# Altium footprint library PASSIVE_THD.PCBLIB: 83 footprints (part 2 of 6)
Each footprint in its own frame and in the unit in brackets; x right, y up, seen from the top. Pads: shape width x height; smd on the part's side, far side on the other; paste and mask are expansions set on the pad; w line width, h text height; cw(c..) or ccw(c..) is an arc to the next point about the centre after c.
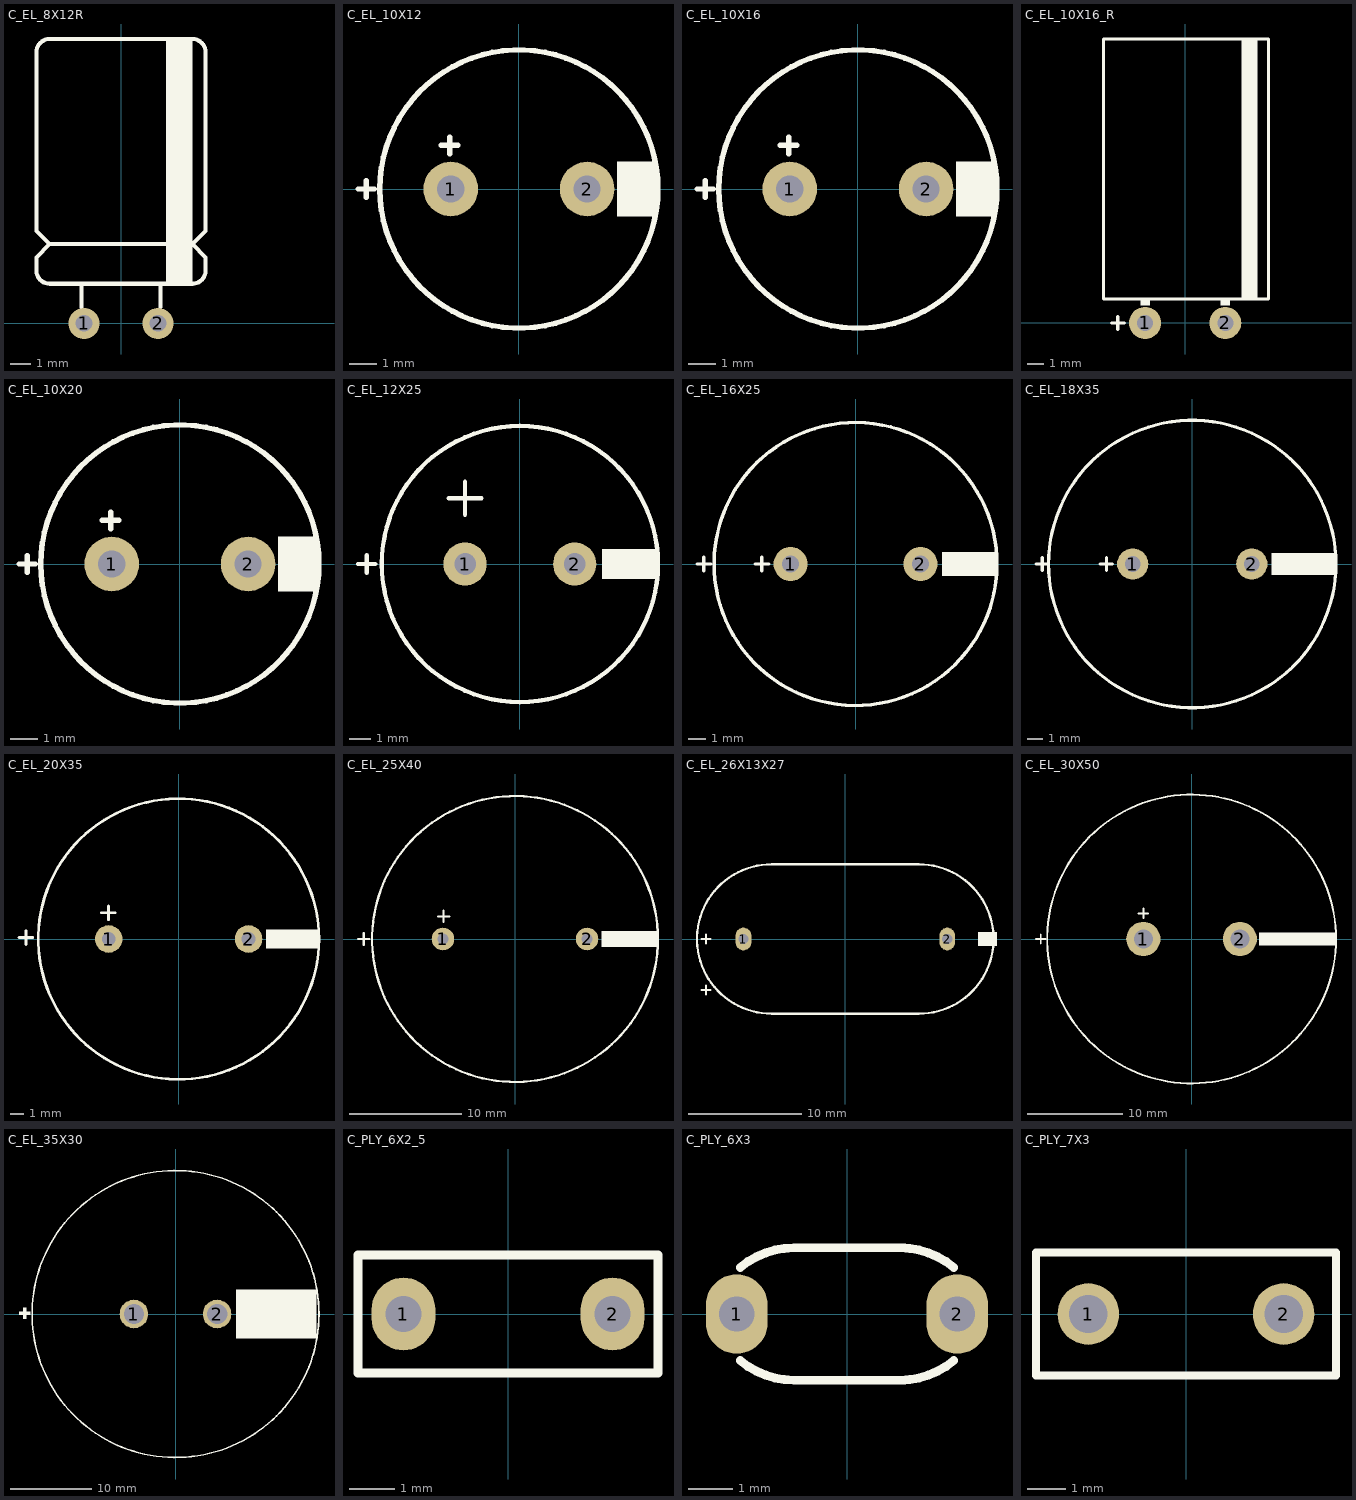
[diagram p1: the footprints below, top view; thin cyan lines are the x and y axes]

## C_EL_8X12R [mm] "Cap Elec, D8.0X12.0H pitch: 3.5mm, RIGHT ANGLE"
pads (2):
  round 1.5 hole 0.8: 1(-1.778,0) 2(1.778,0)
TopOverlay:
  region: 2.159,13.67 2.159,1.905 3.429,1.905 3.429,13.67
  lines w0.2: -1.905,0.762 -1.905,1.905 ; 1.905,0.787 1.905,1.905 ; -3.429,3.81 3.429,3.81 ; -3.429,3.81 -4.064,3.175 -4.064,2.54 ccw(c-3.429,2.54) -3.429,1.905 3.429,1.905 ccw(c3.429,2.54) 4.064,2.54 4.064,3.175 3.429,3.81 ; -3.429,3.81 -4.064,4.445 -4.064,13.035 cw(c-3.429,13.035) -3.429,13.67 3.429,13.67 cw(c3.429,13.035) 4.064,13.035 4.064,4.445 3.429,3.81
3D body "User Library-Cap electro 8x11_5x3_5mm RA.step": height 8.03, standoff -2, extent -4.025,-0.3 4.025,13.521

## C_EL_10X12 [mm] "Cap Elec, D10.0X12.0H pitch: 5.0mm"
height 12
pads (2):
  round 2 hole 1: 1(-2.5,0) 2(2.5,0)
TopOverlay:
  circle w0.2: c0,0 r5.1
  rectangle: 3.6,-1 5.1,1
  lines w0.2: -5.9,0 -5.3,0 ; -5.6,-0.3 -5.6,0.3 ; -2.84,1.6 -2.24,1.6 ; -2.54,1.3 -2.54,1.9
3D body "ELE Radial 10x12.STEP": height 13.7, standoff -1.7, extent -5.069,-5.081 5.05,5.044

## C_EL_10X16 [mm] "Cap Elec, D10.0X16.0H pitch: 5.0mm"
height 16
pads (2):
  round 2 hole 1: 1(-2.5,0) 2(2.5,0)
TopOverlay:
  circle w0.2: c0,0 r5.1
  rectangle: 3.6,-1 5.1,1
  lines w0.2: -5.9,0 -5.3,0 ; -5.6,-0.3 -5.6,0.3 ; -2.84,1.6 -2.24,1.6 ; -2.54,1.3 -2.54,1.9
3D body "User Library-Cap-EL(10x16-5).step": height 16, standoff -3.3, extent -5,-5 5.002,5

## C_EL_10X16_R [mm] "Cap Elec, D10.0X16.0H pitch: 5.0mm"
height 16
pads (2):
  round 2 hole 1: 1(-2.5,0) 2(2.5,0)
TopOverlay:
  region: 2.8,1.5 2.2,1.5 2.2,1.1 2.8,1.1
  rectangle: -2.8,1.1 -2.2,1.5
  rectangle: 3.5,1.5 4.5,17.7
  lines w0.2: -4.6,0 -3.8,0 ; -4.2,-0.4 -4.2,0.4 ; -5.1,1.5 -5.1,17.7 5.2,17.7 5.2,1.5 -5.1,1.5
3D body "User Library-Cap electro 10x16x5_0mm RA.step": height 10.03, standoff -3.68, extent -5.025,-0.363 5.026,17.626

## C_EL_10X20 [mm] "Cap Elec, D10.0X20.0H pitch: 5.0mm, RB.2/.4"
height 20
pads (2):
  round 2 hole 1: 1(-2.5,0) 2(2.5,0)
TopOverlay:
  circle w0.2: c0,0 r5.1
  rectangle: 3.6,-1 5.1,1
  lines w0.2: -5.9,0 -5.3,0 ; -5.6,-0.3 -5.6,0.3 ; -2.84,1.6 -2.24,1.6 ; -2.54,1.3 -2.54,1.9
3D body "CE_R200_D400_H800.step": height 20.62, standoff -2.6, extent -5.08,-5.1 5.08,5.038

## C_EL_12X25 [mm] "Cap Elec, D12.0X25.0H pitch: 5.0mm, RB.2/.5"
pads (2):
  round 2 hole 1: 1(-2.54,0) 2(2.54,0)
TopOverlay:
  circle w0.2: c0,0 r6.4
  rectangle: 3.8,-0.7 6.4,0.7
  lines w0.2: -7.5,0 -6.7,0 ; -7.1,-0.4 -7.1,0.4 ; -3.302,3.048 -1.778,3.048 ; -2.54,2.286 -2.54,3.81
3D body "User Library-Cap-EL(12_5x25-5)T.step": height 25.8, standoff -3.2, extent -6.25,-6.273 6.252,6.211

## C_EL_16X25 [mm] "Cap Elec, D16.0X25.0H pitch: 7.6mm, RB.3/.6"
pads (2):
  round 2 hole 1: 1(-3.81,0) 2(3.81,0)
TopOverlay:
  rectangle: 5.07,-0.7 8.25,0.7
  lines w0.2: -9.3,0 -8.5,0 ; -8.9,-0.4 -8.9,0.4 ; -5.9,0 -5.1,0 ; -5.5,-0.4 -5.5,0.4 ; 8.148,-1.584 cw(c0,0) 8.152,-1.563
3D body "User Library-CE_R300_D650_H1000.step": height 25.4, standoff -3.5, extent -8.235,-8.239 8.25,8.239

## C_EL_18X35 [mm] "Cap Elec, D18.0X35.0H pitch: 7.6mm, RB.3/.7"
pads (2):
  round 2 hole 1: 1(-3.81,0) 2(3.81,0)
TopOverlay:
  circle w0.2: c0,0 r9.2
  rectangle: 5.07,-0.7 9.2,0.7
  lines w0.2: -10,0 -9.2,0 ; -9.6,-0.4 -9.6,0.4 ; -5.9,0 -5.1,0 ; -5.5,-0.4 -5.5,0.4
3D body "User Library-cap-3.step": height 35.05, standoff -3.6, extent -10.424,-10.425 10.473,10.413

## C_EL_20X35 [mm] "Cap Elec, D20.0X35.0H pitch: 10.0mm, RB.4/.8"
pads (2):
  round 2 hole 1: 1(-5.08,0) 2(5.08,0)
TopOverlay:
  circle w0.2: c0,0 r10.2
  rectangle: 6.34,-0.7 10.2,0.7
  lines w0.2: -11.6,0.1 -10.6,0.1 ; -11.1,-0.4 -11.1,0.6 ; -5.6,1.9 -4.6,1.9 ; -5.1,1.4 -5.1,2.4
3D body "User Library-Cap electrolitic radial 20x35.STEP": height 35.8, standoff -0.7, extent -9.996,-9.988 9.997,9.998

## C_EL_25X40 [mm] "Cap Elec, D25.0X40.0H pitch: 12.8mm, RB.5/1"
pads (2):
  round 2 hole 1: 1(-6.4,0) 2(6.4,0)
TopOverlay:
  circle w0.2: c0,0 r12.7
  rectangle: 7.66,-0.7 12.7,0.7
  lines w0.2: -13.95,0 -12.95,0 ; -13.45,-0.5 -13.45,0.5 ; -6.85,2 -5.85,2 ; -6.35,1.5 -6.35,2.5
3D body "User Library-CE_R530_D1000_H1750.step": height 42.2, standoff -2.5, extent -12.7,-12.7 12.7,12.7

## C_EL_26X13X27 [mm] "Cap Elec, 26X13X27mm, 18mm pitch"
height 27
pads (2):
  oval 1.4x2 hole 0.9: 1(-9,0) 2(9,0)
TopOverlay:
  rectangle: 11.7,-0.6 13.4,0.6
  lines w0.2: -12.7,-4.5 -11.9,-4.5 ; -12.7,0 -11.9,0 ; -12.3,-4.9 -12.3,-4.1 ; -12.3,-0.4 -12.3,0.4 ; -6.5,-6.6 cw(c-6.5,0) -6.5,6.6 6.5,6.6 cw(c6.5,0) 6.5,-6.6 -6.5,-6.6
3D body: height 3, standoff -2, extent 8.7,-0.299 9.298,0.3
3D body: height 27, standoff 0, extent -13,-6.5 0,6.5
3D body: height 27, standoff 0, extent 0,-6.5 13,6.5
3D body: height 27, standoff 0, extent -7,-6.5 7,6.5
3D body: height 3, standoff -2, extent -9.297,-0.299 -8.7,0.299

## C_EL_30X50 [mm] "Cap Elec, D30.0X50.0H pitch: 10.0mm"
pads (2):
  round 3.6 hole 2: 1(-5.08,0) 2(5.08,0)
TopOverlay:
  circle w0.2: c0,0 r15.2
  rectangle: 7.1,-0.7 15.2,0.7
  lines w0.2: -16.38,0 -15.38,0 ; -15.88,-0.5 -15.88,0.5 ; -5.58,2.7 -4.58,2.7 ; -5.08,2.2 -5.08,3.2
3D body "User Library-Assy_CE_R400_D1200_H2000.STEP": height 50.8, standoff -6.89, extent -15.222,-15.2 15.24,15.28

## C_EL_35X30 [mm] "Cap Elec, D35.0X30.0H pitch: 10.0mm, 470uF/400V, RB.44/1.3"
height 33
pads (2):
  round 3.5 / inner round 3.5 / far side oval 3.5x5.5 hole 2.5: 1(-5.1,0) 2(5.1,0)
TopOverlay:
  circle w0.2: c0,0 r17.6
  rectangle: 7.4,-3 17.3,3
  rectangle: -19.2,-0.1 -17.8,0.3
  region: -18.3,-0.6 -18.3,0.8 -18.7,0.8 -18.7,-0.6
3D body "User Library-el_cap_470uF-400V.step": height 46.5, standoff -3.7, extent -17.5,-17.474 17.5,17.474

## C_PLY_6X2_5 [mm] "CAP, FILM MKT, 6.3X2.4mm, pitch: 4.7mm"
height 6.5
pads (2):
  oval 1.4x1.6 hole 0.8 mask+0.075: 1(-2.3,0) 2(2.3,0)
TopOverlay:
  lines w0.2: -3.3,-1.3 -3.3,1.3 3.3,1.3 3.3,-1.3 -3.3,-1.3
3D body "cap.STEP": height 6.34, standoff -1.96, extent -3.15,-1.2 3.15,1.2

## C_PLY_6X3 [mm] "CAP, POLYESTER, 5.8X3.5mm pitch: 5.0mm"
pads (2):
  oval 1.4x1.8 hole 0.8: 1(-2.5,0) 2(2.5,0)
TopOverlay:
  lines w0.2: -2.421,-1.055 ccw(c-1.2,0.4) -1.2,-1.5 1.3,-1.5 ; -2.421,1.055 cw(c-1.2,-0.4) -1.2,1.5 1.3,1.5 ; 1.2,-1.5 ccw(c1.2,0.4) 2.421,-1.055 ; 1.2,1.5 cw(c1.2,-0.4) 2.421,1.055
3D body "CAP 6mm Adasi.STEP": height 8.5, standoff -25.12, extent -2.95,-1.9 3.05,1.9

## C_PLY_7X3 [mm] "CAP, POLYESTER, 7.5X3mm pitch: 5.0mm"
pads (2):
  round 1.6 / inner round 1.6 / far side oval 1.6x2.4 hole 1: 1(-2.54,0) 2(2.54,0)
TopOverlay:
  lines w0.2: -3.9,-1.6 -3.9,1.6 3.9,1.6 3.9,-1.6 -3.9,-1.6
3D body "User Library-100n.step": height 7.6, standoff -4.6, extent -3.75,-1.25 3.75,1.25